# Altium footprint library Integrados.PcbLib: 96 footprints (part 1 of 6)
Each footprint in its own frame and in the unit in brackets; x right, y up, seen from the top. Pads: shape width x height; smd on the part's side, far side on the other; paste and mask are expansions set on the pad; w line width, h text height; cw(c..) or ccw(c..) is an arc to the next point about the centre after c.
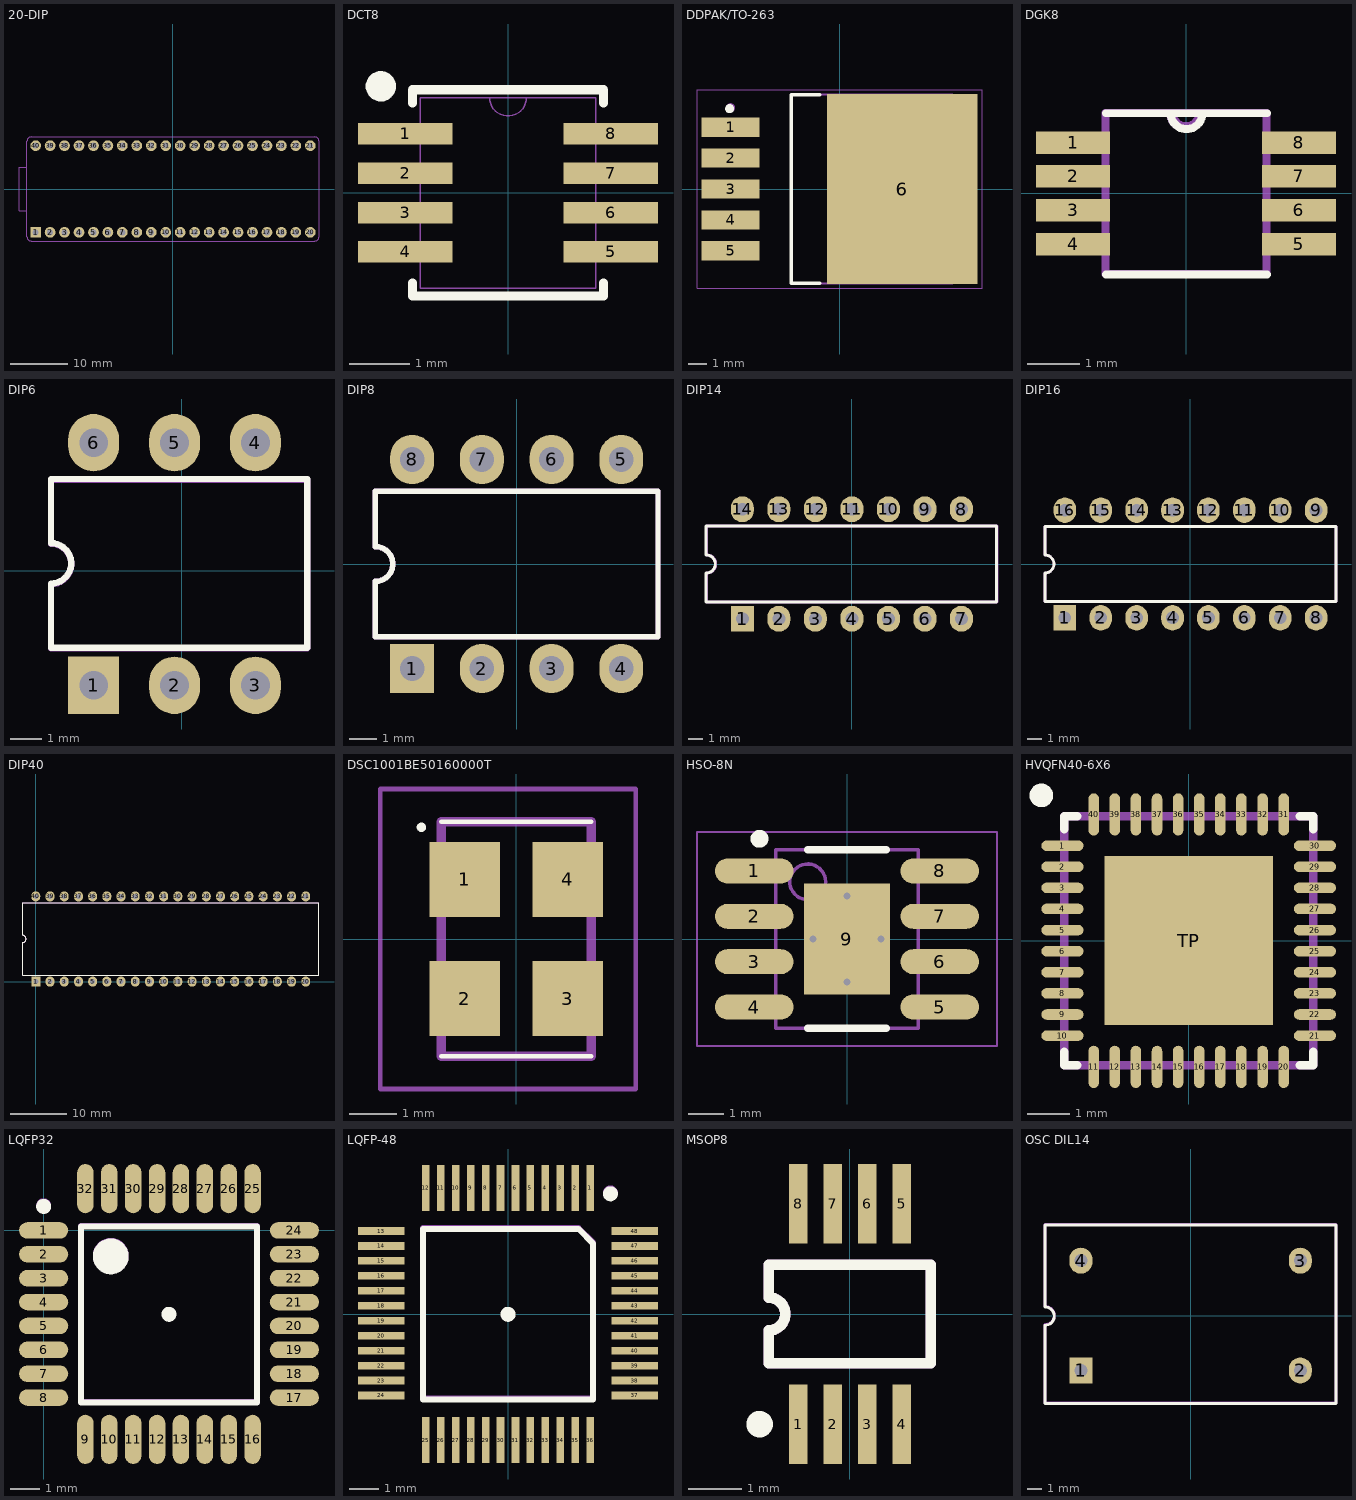
[diagram p0: the footprints below, top view; thin cyan lines are the x and y axes]

## 20-DIP [mil]
pads (40):
  rect 74x74 hole 40: 1(-950,-300)
  round 74 hole 40: 2(-850,-300) 3(-750,-300) 4(-650,-300) 5(-550,-300) 6(-450,-300) 7(-350,-300) 8(-250,-300) 9(-150,-300) 10(-50,-300) 11(50,-300) 12(150,-300) 13(250,-300) 14(350,-300) 15(450,-300) 16(550,-300) 17(650,-300) 18(750,-300) 19(850,-300) 20(950,-300) 21(950,300) 22(850,300) 23(750,300) 24(650,300) 25(550,300) 26(450,300) 27(350,300) 28(250,300) 29(150,300) 30(50,300) 31(-50,300) 32(-150,300) 33(-250,300) 34(-350,300) 35(-450,300) 36(-550,300) 37(-650,300) 38(-750,300) 39(-850,300) 40(-950,300)
Mechanical 51:
  lines w5: -1010,-150 -1065,-150 -1065,150 -1010,150 ; -1010,-330 ccw(c-980,-330) -980,-360 980,-360 ccw(c980,-330) 1010,-330 1010,330 ccw(c980,330) 980,360 -980,360 ccw(c-980,330) -1010,330 -1010,-330

## DCT8 [mil]
pads (8):
  rect 61.5x14 smd: 1(-66.75,38.39) 2(-66.75,12.8) 3(-66.75,-12.8) 4(-66.75,-38.39) 5(66.75,-38.39) 6(66.75,-12.8) 7(66.75,12.8) 8(66.75,38.39)
Top Overlay:
  circle w9.84: c-82.68,69.29 r4.92
  lines w6: -62,-58.49 -62,-67 62,-67 62,-58.49 ; -62,58.49 -62,67 62,67 62,58.49
Mechanical 29:
  lines w1: -12,62 ccw(c0,62) 12,62 ; -83.5,-44.39 -83.5,-32.39 -57,-32.39 -57,-44.39 -83.5,-44.39 ; -83.5,-18.8 -83.5,-6.8 -57,-6.8 -57,-18.8 -83.5,-18.8 ; -83.5,6.8 -83.5,18.8 -57,18.8 -57,6.8 -83.5,6.8 ; -83.5,32.39 -83.5,44.39 -57,44.39 -57,32.39 -83.5,32.39 ; -57,-62 57,-62 57,62 -57,62 -57,-62 ; 57,-44.39 57,-32.39 83.5,-32.39 83.5,-44.39 57,-44.39 ; 57,-18.8 57,-6.8 83.5,-6.8 83.5,-18.8 57,-18.8 ; 57,6.8 57,18.8 83.5,18.8 83.5,6.8 57,6.8 ; 57,32.39 57,44.39 83.5,44.39 83.5,32.39 57,32.39
  text "*" at -65,65 h31.25
3D body "DCT-8.STEP": height 51.18, standoff 0, extent -81.5,-59.84 83.86,60.24

## DDPAK/TO-263 [mm] "D2-PAK, 6-Leads, Body 8.6x10.2mm, Pitch 1.7mm, Lead Span 14.1mm, IPC Medium Density"
height 4.65
pads (6):
  rect 3.2x1.05 smd: 1(-6,3.4) 2(-6,1.7) 3(-6,0) 4(-6,-1.7) 5(-6,-3.4)
  rect 8.3x10.45 smd: 6(3.45,0)
Top Overlay:
  circle w0.25: c-6.05,4.425 r0.125
  lines w0.2: -1.1,-5.2 -2.65,-5.2 -2.65,5.2 -1.1,5.2
Mechanical 13:
  lines w0.1: -2.65,-5.2 -2.65,5.2 6.24,5.2 6.24,-5.2 -2.65,-5.2
Mechanical 15:
  lines w0.05: -7.85,-5.475 7.85,-5.475 7.85,5.475 -7.85,5.475 -7.85,-5.475
  lines w0.1: -0.5,0 0.5,0 ; 0,-0.5 0,0.5
Mechanical 29:
  circle w0.25: c-6,4.475 r0.125
  lines w0.05: -7.85,-5.475 -7.85,5.475 7.85,5.475 7.85,-5.475 -7.85,-5.475
  lines w0.1: -0.5,0 0.5,0 ; 0,-0.5 0,0.5
  text "'.Designator'" at 1.042,-0.232 h0.5
3D body "TO263-5.STEP": height 4.78, standoff -0.02, extent -7.35,-4.98 8.32,5.02

## DGK8 [mil]
height 43
pads (8):
  rect 56x17 smd: 1(-85.5,38.39) 2(-85.5,12.8) 3(-85.5,-12.8) 4(-85.5,-38.39) 5(85.5,-38.39) 6(85.5,-12.8) 7(85.5,12.8) 8(85.5,38.39)
Top Overlay:
  lines w6: -60.61,-61.39 61.39,-61.39 ; -60.61,60.61 61.39,60.61 ; -11.61,60.61 ccw(c0.39,60.61) 12.39,60.61
Mechanical 1:
  lines w0: -12,61 ccw(c0,61) 12,61 ; -99.5,-45.89 -99.5,-30.89 -61,-30.89 -61,-45.89 -99.5,-45.89 ; -99.5,-20.3 -99.5,-5.3 -61,-5.3 -61,-20.3 -99.5,-20.3 ; -99.5,5.3 -99.5,20.3 -61,20.3 -61,5.3 -99.5,5.3 ; -99.5,30.89 -99.5,45.89 -61,45.89 -61,30.89 -99.5,30.89 ; -61,-61 61,-61 61,61 -61,61 -61,-61 ; 61,-45.89 61,-30.89 99.5,-30.89 99.5,-45.89 61,-45.89 ; 61,-20.3 61,-5.3 99.5,-5.3 99.5,-20.3 61,-20.3 ; 61,5.3 61,20.3 99.5,20.3 99.5,5.3 61,5.3 ; 61,30.89 61,45.89 99.5,45.89 99.5,30.89 61,30.89
  lines w6: -10.17,61 ccw(c0,61) 10.17,61 ; -61,-61 -61,61 61,61 61,-61 -61,-61
Mechanical 29:
  lines w6: -61,-61 61,-61 ; -61,61 61,61 ; -12,61 ccw(c0,61) 12,61
  text "'.Designator'" at -51.57,-12.2 h19.68

## DIP6 [mm]
pads (6):
  rect 1.6x1.8 hole 0.9: 1(-2.769,-3.601)
  oval 1.6x1.8 hole 0.9: 2(-0.229,-3.601) 3(2.311,-3.601) 4(2.311,4.019) 5(-0.229,4.019) 6(-2.769,4.019)
Top Overlay:
  lines w0.2: -4.109,-2.421 -4.109,-0.406 ccw(c-4.109,0.229) -4.109,0.864 -4.109,2.879 3.937,2.879 3.937,-2.421 -4.109,-2.421
Mechanical 29:
  lines w0.2: -4.109,-2.441 3.937,-2.441 3.937,2.859 -4.109,2.859 -4.109,0.844 cw(c-4.109,0.209) -4.109,-0.426 -4.109,-2.441
  text "'.Designator'" at -2.84,-0.07 h0.5
3D body "DIP6.step": height 4.31, standoff -3.28, extent -4.191,-3.81 3.889,4.19

## DIP8 [mm]
pads (8):
  rect 1.6x1.8 hole 0.9: 1(-3.81,-3.81)
  oval 1.6x1.8 hole 0.9: 2(-1.27,-3.81) 3(1.27,-3.81) 4(3.81,-3.81) 5(3.81,3.81) 6(1.27,3.81) 7(-1.27,3.81) 8(-3.81,3.81)
Top Overlay:
  lines w0.2: -5.15,-2.65 -5.15,-0.635 ccw(c-5.15,0) -5.15,0.635 -5.15,2.65 5.15,2.65 5.15,-2.65 -5.15,-2.65
Mechanical 29:
  lines w0.2: -5.15,-2.65 5.15,-2.65 5.15,2.65 -5.15,2.65 -5.15,0.635 cw(c-5.15,0) -5.15,-0.635 -5.15,-2.65
  text "'.Designator'" at -3.912,-0.249 h0.5
3D body "DIP8-DEFAULT.step": height 4.19, standoff -2.67, extent -5.706,-3.953 5.724,3.921

## DIP14 [mm]
pads (14):
  rect 1.6x1.8 hole 0.9: 1(-7.62,-3.81)
  oval 1.6x1.8 hole 0.9: 2(-5.08,-3.81) 3(-2.54,-3.81) 4(0,-3.81) 5(2.54,-3.81) 6(5.08,-3.81) 7(7.62,-3.81) 8(7.62,3.81) 9(5.08,3.81) 10(2.54,3.81) 11(0,3.81) 12(-2.54,3.81) 13(-5.08,3.81) 14(-7.62,3.81)
Top Overlay:
  lines w0.2: -10.14,-2.65 -10.14,-0.635 ccw(c-10.14,0) -10.14,0.635 -10.14,2.65 10.06,2.65 10.06,-2.65 -10.14,-2.65
Mechanical 29:
  lines w0.2: -10.1,-2.65 10.1,-2.65 10.1,2.65 -10.1,2.65 -10.1,0.635 cw(c-10.1,0) -10.1,-0.635 -10.1,-2.65
  text "'.Designator'" at -9.008,-0.28 h0.5
3D body "DIP14.step": height 4.19, standoff -2.67, extent -9.521,-3.787 9.529,4.087

## DIP16 [mm]
pads (16):
  rect 1.6x1.8 hole 0.9: 1(-8.89,-3.81)
  oval 1.6x1.8 hole 0.9: 2(-6.35,-3.81) 3(-3.81,-3.81) 4(-1.27,-3.81) 5(1.27,-3.81) 6(3.81,-3.81) 7(6.35,-3.81) 8(8.89,-3.81) 9(8.89,3.81) 10(6.35,3.81) 11(3.81,3.81) 12(1.27,3.81) 13(-1.27,3.81) 14(-3.81,3.81) 15(-6.35,3.81) 16(-8.89,3.81)
Top Overlay:
  lines w0.2: -10.3,-2.65 10.3,-2.65 10.3,2.65 -10.3,2.65 -10.3,0.635 cw(c-10.3,0) -10.3,-0.635 -10.3,-2.65
Mechanical 29:
  lines w0.2: -10.3,-2.65 -10.3,-0.635 ccw(c-10.3,0) -10.3,0.635 -10.3,2.65 10.3,2.65 10.3,-2.65 -10.3,-2.65
3D body "DIP16.step": height 4.19, standoff -2.57, extent -10.87,-4.003 10.72,3.871

## DIP40 [mm]
pads (40):
  rect 1.6x1.8 hole 0.9: 1(0,0)
  oval 1.6x1.8 hole 0.9: 2(2.54,0) 3(5.08,0) 4(7.62,0) 5(10.16,0) 6(12.7,0) 7(15.24,0) 8(17.78,0) 9(20.32,0) 10(22.86,0) 11(25.4,0) 12(27.94,0) 13(30.48,0) 14(33.02,0) 15(35.56,0) 16(38.1,0) 17(40.64,0) 18(43.18,0) 19(45.72,0) 20(48.26,0) 21(48.26,15.24) 22(45.72,15.24) 23(43.18,15.24) 24(40.64,15.24) 25(38.1,15.24) 26(35.56,15.24) 27(33.02,15.24) 28(30.48,15.24) 29(27.94,15.24) 30(25.4,15.24) 31(22.86,15.24) 32(20.32,15.24) 33(17.78,15.24) 34(15.24,15.24) 35(12.7,15.24) 36(10.16,15.24) 37(7.62,15.24) 38(5.08,15.24) 39(2.54,15.24) 40(0,15.24)
Top Overlay:
  lines w0.2: -2.37,1.18 -2.37,6.995 ccw(c-2.37,7.63) -2.37,8.265 -2.37,14.08 50.63,14.08 50.63,1.18 -2.37,1.18
Mechanical 29:
  lines w0.2: -2.37,1.17 50.63,1.17 50.63,14.07 -2.37,14.07 -2.37,8.255 cw(c-2.37,7.62) -2.37,6.985 -2.37,1.17
  text "'.Designator'" at 20.828,7.321 h0.5
3D body "DIP40-600.step": height 5.9, standoff -2.38, extent -2.057,-0.1 50.393,15.39

## DSC1001BE50160000T [mm] "1.8V-3.3V Low-Power Precision CMOS Oscillators"
pads (4):
  rect 1.5x1.6 smd: 1(-1.1,1.27) 2(-1.1,-1.27) 3(1.1,-1.27) 4(1.1,1.27)
Top Overlay:
  lines w0.1: -1.6,-2.5 1.6,-2.5 ; -1.6,2.5 1.6,2.5 ; -2.073,2.383 ccw(c-2.023,2.383) -1.973,2.383 ccw(c-2.023,2.383) -2.073,2.383
Mechanical 15:
  lines w0.2: -1.6,-2.5 1.6,-2.5 1.6,2.5 -1.6,2.5 -1.6,-2.5
Mechanical 20:
  lines w0.1: -2.9,-3.2 2.55,-3.2 2.55,3.2 -2.9,3.2 -2.9,-3.2

## HSO-8N [mm] "SOIC, 8-Leads, Body 4.9x3.9mm, Pitch 1.27mm, Thermal Pad, IPC Medium Density"
height 1.75
pads (9):
  oval 2.2x0.7 smd: 1(-2.6,1.905) 2(-2.6,0.635) 3(-2.6,-0.635) 4(-2.6,-1.905) 5(2.6,-1.905) 6(2.6,-0.635) 7(2.6,0.635) 8(2.6,1.905)
  rect 2.4x3.1 smd paste-1.2: 9(0,0)
via -0.95,0 diameter 0.5 hole 0.2
via 0,-1.2 diameter 0.5 hole 0.2
via 0,1.2 diameter 0.5 hole 0.2
via 0.95,0 diameter 0.5 hole 0.2
Top Overlay:
  circle w0.25: c-2.45,2.805 r0.125
  lines w0.2: -1.1,-2.5 1.1,-2.5 ; -1.1,2.5 1.1,2.5
Top Paste:
  rectangle: 0.1,-1.45 1.1,-0.1
  region: -0.1,-0.1 -1.1,-0.1 -1.1,-1.45 -0.1,-1.45
  region: -0.1,1.45 -1.1,1.45 -1.1,0.1 -0.1,0.1
  rectangle: 0.1,0.1 1.1,1.45
Mechanical 15:
  lines w0.05: -4.2,-3 -4.2,3 4.2,3 4.2,-3 -4.2,-3
  lines w0.1: -0.5,0 0.5,0 ; 0,-0.5 0,0.5
Mechanical 29:
  circle w0.1: c-1.1,1.6 r0.5
  lines w0.1: -2,-2.5 -2,2.5 2,2.5 2,-2.5 -2,-2.5
  text "'.Designator'" at -0.06,0.07 h0.5
3D body "so-8.step": height 1.88, standoff -0.03, extent -3.144,-2.489 3.195,2.515

## HVQFN40-6X6 [mm] "HVQFN40-6X6"
pads (41):
  rrect100% 1x0.25 smd: 1(-2.99,2.25) 2(-2.99,1.75) 3(-2.99,1.25) 4(-2.99,0.75) 5(-2.99,0.25) 6(-2.99,-0.25) 7(-2.99,-0.75) 8(-2.99,-1.25) 9(-2.99,-1.75) 10(-2.99,-2.25) 21(2.99,-2.25) 22(2.99,-1.75) 23(2.99,-1.25) 24(2.99,-0.75) 25(2.99,-0.25) 26(2.99,0.25) 27(2.99,0.75) 28(2.99,1.25) 29(2.99,1.75) 30(2.99,2.25)
  rrect100% 0.25x1 smd: 11(-2.25,-2.99) 12(-1.75,-2.99) 13(-1.25,-2.99) 14(-0.75,-2.99) 15(-0.25,-2.99) 16(0.25,-2.99) 17(0.75,-2.99) 18(1.25,-2.99) 19(1.75,-2.99) 20(2.25,-2.99) 31(2.25,2.99) 32(1.75,2.99) 33(1.25,2.99) 34(0.75,2.99) 35(0.25,2.99) 36(-0.25,2.99) 37(-0.75,2.99) 38(-1.25,2.99) 39(-1.75,2.99) 40(-2.25,2.99)
  rect 4x4 smd: TP(0,0)
Top Overlay:
  circle w0.305: c-3.49,3.44 r0.127
  lines w0.203: -2.95,-2.638 -2.95,-2.95 -2.638,-2.95 ; -2.95,2.638 -2.95,2.95 -2.638,2.95 ; 2.638,-2.95 2.95,-2.95 2.95,-2.638 ; 2.638,2.95 2.95,2.95 2.95,2.638
Top Paste:
  rectangle: -1.8,0.8 -0.8,1.8
  rectangle: -0.5,0.8 0.5,1.8
  rectangle: 0.8,0.8 1.8,1.8
  rectangle: -1.8,-0.501 -0.8,0.5
  rectangle: -1.8,-1.801 -0.8,-0.801
  rectangle: -0.5,-0.501 0.5,0.5
  rectangle: -0.5,-1.801 0.5,-0.801
  rectangle: 0.8,-1.801 1.8,-0.801
  rectangle: 0.8,-0.501 1.8,0.5
Mechanical 16:
  lines w0.203: -2.95,-2.95 -2.95,2.95 2.95,2.95 2.95,-2.95 -2.95,-2.95
3D body "QFN40.step": height 0.8, standoff 0, extent -3,-3.02 3,2.98

## LQFP32 [mm]
pads (32):
  oval 1.65x0.55 smd: 1(0,0) 2(0,-0.8) 3(0,-1.6) 4(0,-2.4) 5(0,-3.2) 6(0,-4) 7(0,-4.8) 8(0,-5.6) 17(8.4,-5.6) 18(8.4,-4.8) 19(8.4,-4) 20(8.4,-3.2) 21(8.4,-2.4) 22(8.4,-1.6) 23(8.4,-0.8) 24(8.4,0)
  oval 0.55x1.65 smd: 9(1.4,-7) 10(2.2,-7) 11(3,-7) 12(3.8,-7) 13(4.6,-7) 14(5.4,-7) 15(6.2,-7) 16(7,-7) 25(7,1.4) 26(6.2,1.4) 27(5.4,1.4) 28(4.6,1.4) 29(3.8,1.4) 30(3,1.4) 31(2.2,1.4) 32(1.4,1.4)
Top Overlay:
  circle w0.25: c0,0.805 r0.125
  circle w0.6: c2.25,-0.87 r0.3
  circle w0.25: c4.2,-2.81 r0.125
  lines w0.2: 1.25,-5.77 1.25,0.13 7.15,0.13 7.15,-5.77 1.25,-5.77
Mechanical 29:
  circle w0.6: c2.25,-0.85 r0.3
  circle w0.25: c0,0.825 r0.125
  lines w0.2: 1.25,-5.75 7.15,-5.75 7.15,0.15 1.25,0.15 1.25,-5.75
  text "'.Designator'" at 3.861,-0.138 h0.5
3D body "LQFP32.STEP": height 1.63, standoff -0.09, extent -0.309,-7.349 8.691,1.651

## LQFP-48 [mil] "LQFP 48 pitch .5 mm"
pads (48):
  rect 10x61.02 smd: 1(108.27,166) 2(88.58,166) 3(68.9,166) 4(49.21,166) 5(29.53,166) 6(9.84,166) 7(-9.84,166) 8(-29.53,166) 9(-49.21,166) 10(-68.9,166) 11(-88.58,166) 12(-108.27,166) 25(-108.27,-166) 26(-88.58,-166) 27(-68.9,-166) 28(-49.21,-166) 29(-29.53,-166) 30(-9.84,-166) 31(9.84,-166) 32(29.53,-166) 33(49.21,-166) 34(68.9,-166) 35(88.58,-166) 36(108.27,-166)
  rect 61.02x10 smd: 13(-167,109.27) 14(-167,89.58) 15(-167,69.9) 16(-167,50.21) 17(-167,30.53) 18(-167,10.84) 19(-167,-8.84) 20(-167,-28.53) 21(-167,-48.21) 22(-167,-67.9) 23(-167,-87.58) 24(-167,-107.27) 37(167,-107.27) 38(167,-87.58) 39(167,-67.9) 40(167,-48.21) 41(167,-28.53) 42(167,-8.84) 43(167,10.84) 44(167,30.53) 45(167,50.21) 46(167,69.9) 47(167,89.58) 48(167,109.27)
Top Overlay:
  circle w9.84: c134.84,158.28 r4.92
  circle w9.84: c0,-0.39 r4.92
  lines w7.87: -112.2,-112.39 112.2,-112.39 112.2,92.61 92.8,112.02 -112.2,112.02 -112.2,-112.39
Mechanical 29:
  circle w9.84: c134.84,159.46 r4.92
  lines w7.87: -112.2,-111.2 -112.2,113.2 92.8,113.2 112.2,93.8 112.2,-111.2 -112.2,-111.2
  text "'.Designator'" at -10.57,103.61 h19.68
3D body "LQFP-48.step": height 61.42, standoff 0, extent -177.66,-176.17 176.67,178.16

## MSOP8 [mm] "Shrink Small Outline; 8 Leads; Body Width 3 mm; Pitch 0.65 mm"
height 1.1
pads (8):
  rect 0.35x1.5 smd: 1(-0.975,-2.075) 2(-0.325,-2.075) 3(0.325,-2.075) 4(0.975,-2.075) 5(0.975,2.075) 6(0.325,2.075) 7(-0.325,2.075) 8(-0.975,2.075)
Top Overlay:
  circle w0.25: c-1.7,-2.075 r0.125
  lines w0.2: -1.525,-0.925 -1.525,-0.308 ccw(c-1.525,0) -1.525,0.308 -1.525,0.925 1.525,0.925 1.525,-0.925 -1.525,-0.925
Mechanical 29:
  lines w0.2: -1.525,-0.925 1.525,-0.925 1.525,0.925 -1.525,0.925 -1.525,0.308 cw(c-1.525,0) -1.525,-0.308 -1.525,-0.925
  text "'.Designator'" at -1.002,-0.259 h0.5
3D body "MSOP8.step": height 0.92, standoff 0, extent -1.5,-2.525 1.5,2.475

## OSC DIL14 [mm]
pads (4):
  rect 1.6x1.8 hole 0.9: 1(-7.62,-3.81)
  oval 1.6x1.8 hole 0.9: 2(7.62,-3.81) 3(7.62,3.81) 4(-7.62,3.81)
Top Overlay:
  lines w0.2: -10.1,-6.111 10.1,-6.111 10.1,6.285 -10.1,6.285 -10.1,0.595 cw(c-10.1,-0.04) -10.1,-0.675 -10.1,-6.111
Mechanical 29:
  lines w0.2: -10.1,-6.071 -10.1,-0.635 ccw(c-10.1,0) -10.1,0.635 -10.1,6.325 10.1,6.325 10.1,-6.071 -10.1,-6.071
  text "'.Designator'" at -8.812,-0.289 h0.5
3D body "ocs-1.step": height 5.4, standoff -2.5, extent -10.201,-6.174 10.049,6.426